# Altium footprint library laihi.PcbLib: 222 footprints (part 7 of 14)
Each footprint in its own frame and in the unit in brackets; x right, y up, seen from the top. Pads: shape width x height; smd on the part's side, far side on the other; paste and mask are expansions set on the pad; w line width, h text height; cw(c..) or ccw(c..) is an arc to the next point about the centre after c.
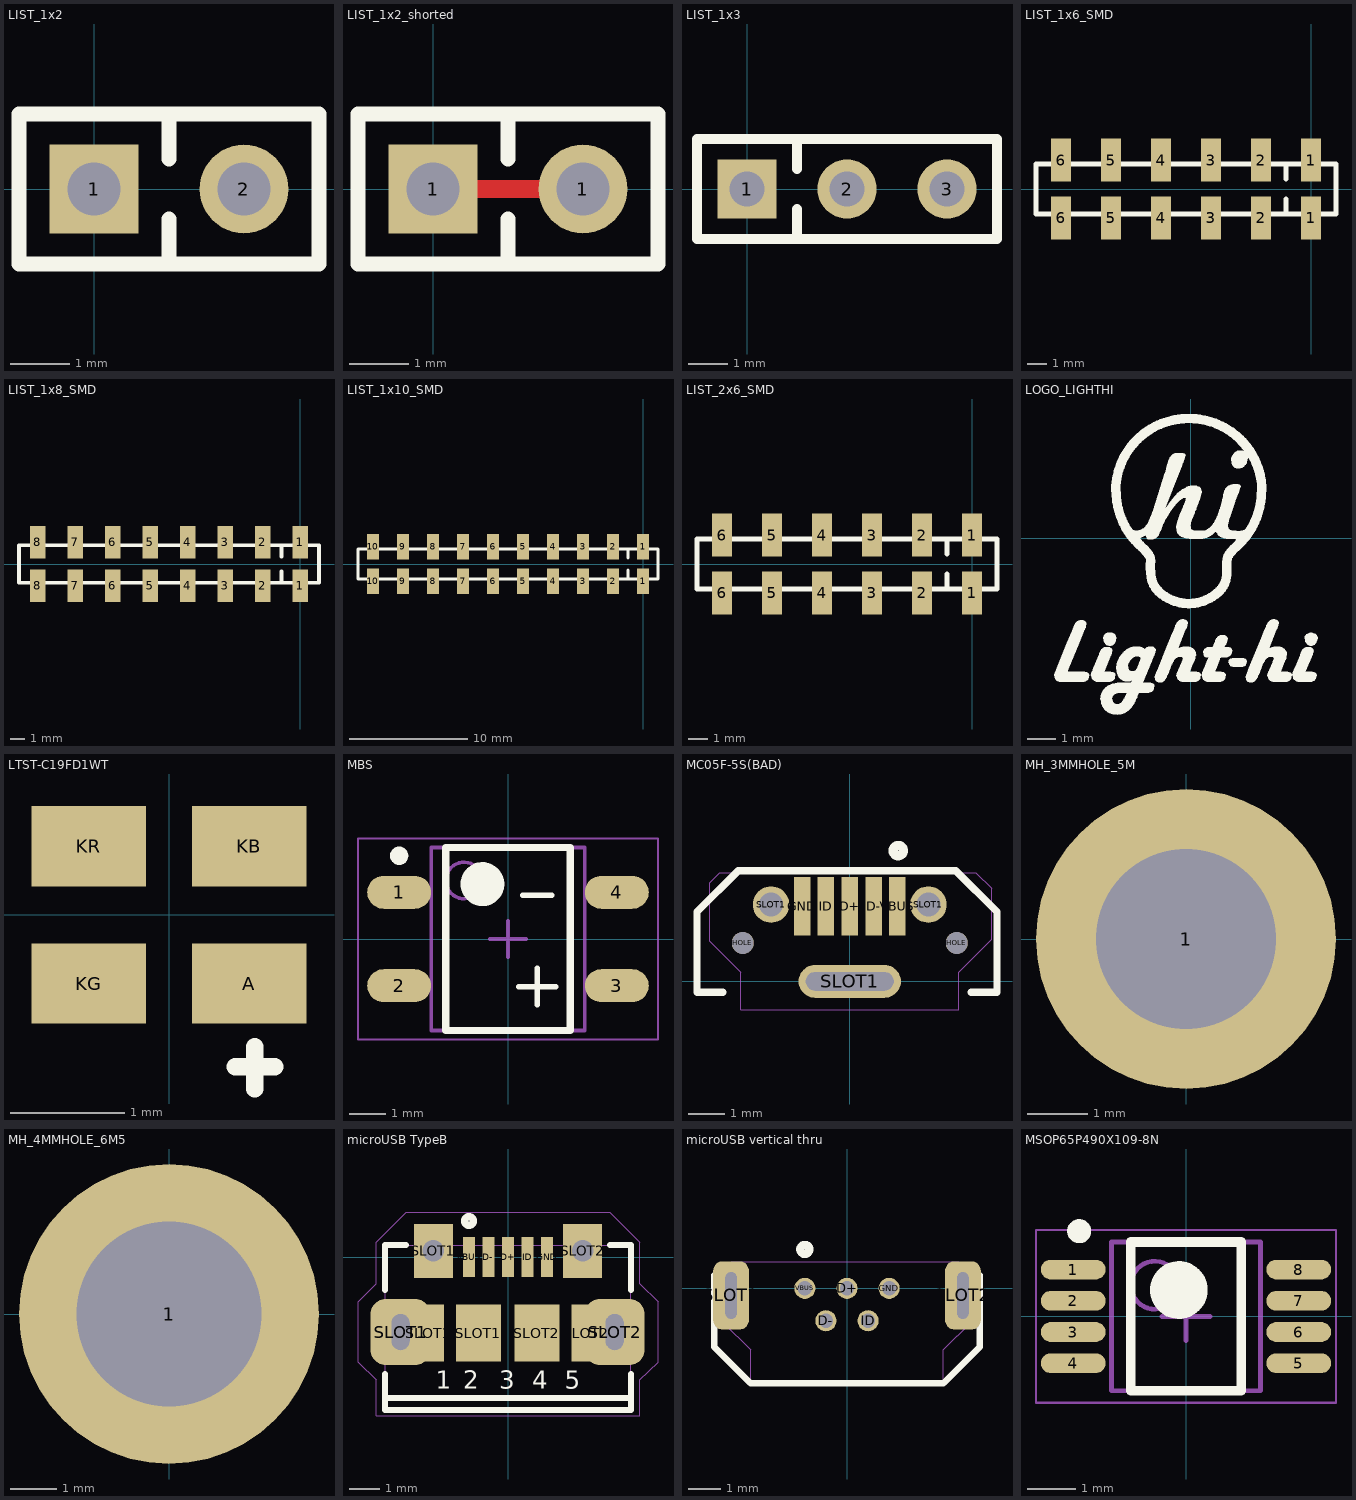
[diagram p6: the footprints below, top view; thin cyan lines are the x and y axes]

## LIST_1x2 [mm]
pads (2):
  rect 1.5x1.5 hole 0.9: 1(0,0)
  round 1.5 hole 0.9: 2(2.54,0)
Top Overlay:
  lines w0.254: 1.27,-1.27 1.27,-0.508 ; 1.27,0.508 1.27,1.27 ; -1.27,-1.27 3.81,-1.27 3.81,1.27 -1.27,1.27 -1.27,-1.27

## LIST_1x2_shorted [mm]
pads (2):
  rect 1.5x1.5 hole 0.9: 1(0,0)
  round 1.5 hole 0.9: 1(2.54,0)
Top Layer:
  lines w0.305: 0,0 2.54,0
Top Overlay:
  lines w0.254: 1.27,-1.27 1.27,-0.508 ; 1.27,0.508 1.27,1.27 ; -1.27,-1.27 -1.27,1.27 3.81,1.27 3.81,-1.27 -1.27,-1.27
Top Solder:
  rectangle: 1,-0.5 1.5,0.5

## LIST_1x3 [mm]
pads (3):
  rect 1.5x1.5 hole 0.9: 1(0,0)
  round 1.5 hole 0.9: 2(2.54,0) 3(5.08,0)
Top Overlay:
  lines w0.254: 1.27,-1.27 1.27,-0.508 ; 1.27,0.508 1.27,1.27 ; -1.27,-1.27 6.35,-1.27 6.35,1.27 -1.27,1.27 -1.27,-1.27
3D body "pin_header_aw140-eg-g03d.stp": height 8.2, standoff -3, extent -1.27,-1.27 6.25,1.23

## LIST_1x6_SMD [mm] "Pin List, 2.54mm, SMD"
height 9.5
pads (12):
  rect 1.02x2.19 smd: 1(0,-1.465) 1(0,1.465) 2(-2.54,-1.465) 2(-2.54,1.465) 3(-5.08,-1.465) 3(-5.08,1.465) 4(-7.62,-1.465) 4(-7.62,1.465) 5(-10.16,-1.465) 5(-10.16,1.465) 6(-12.7,-1.465) 6(-12.7,1.465)
Top Overlay:
  lines w0.254: -1.27,-1.27 -1.27,-0.508 ; -1.27,0.508 -1.27,1.27 ; -13.97,-1.27 1.27,-1.27 1.27,1.27 -13.97,1.27 -13.97,-1.27

## LIST_1x8_SMD [mm] "Pin List, 2.54mm, SMD"
height 9.5
pads (16):
  rect 1.02x2.19 smd: 1(0,-1.465) 1(0,1.465) 2(-2.54,-1.465) 2(-2.54,1.465) 3(-5.08,-1.465) 3(-5.08,1.465) 4(-7.62,-1.465) 4(-7.62,1.465) 5(-10.16,-1.465) 5(-10.16,1.465) 6(-12.7,-1.465) 6(-12.7,1.465) 7(-15.24,-1.465) 7(-15.24,1.465) 8(-17.78,-1.465) 8(-17.78,1.465)
Top Overlay:
  lines w0.254: -1.27,-1.27 -1.27,-0.508 ; -1.27,0.508 -1.27,1.27 ; -19.05,-1.27 1.27,-1.27 1.27,1.27 -19.05,1.27 -19.05,-1.27

## LIST_1x10_SMD [mm] "Pin List, 2.54mm, SMD"
height 9.5
pads (20):
  rect 1.02x2.19 smd: 1(0,-1.465) 1(0,1.465) 2(-2.54,-1.465) 2(-2.54,1.465) 3(-5.08,-1.465) 3(-5.08,1.465) 4(-7.62,-1.465) 4(-7.62,1.465) 5(-10.16,-1.465) 5(-10.16,1.465) 6(-12.7,-1.465) 6(-12.7,1.465) 7(-15.24,-1.465) 7(-15.24,1.465) 8(-17.78,-1.465) 8(-17.78,1.465) 9(-20.32,-1.465) 9(-20.32,1.465) 10(-22.86,-1.465) 10(-22.86,1.465)
Top Overlay:
  lines w0.254: -1.27,-1.27 -1.27,-0.508 ; -1.27,0.508 -1.27,1.27 ; -24.13,-1.27 1.27,-1.27 1.27,1.27 -24.13,1.27 -24.13,-1.27

## LIST_2x6_SMD [mm] "Pin List, 2.54mm, SMD"
height 9.5
pads (12):
  rect 1.02x2.19 smd: 1(0,-1.465) 1(0,1.465) 2(-2.54,-1.465) 2(-2.54,1.465) 3(-5.08,-1.465) 3(-5.08,1.465) 4(-7.62,-1.465) 4(-7.62,1.465) 5(-10.16,-1.465) 5(-10.16,1.465) 6(-12.7,-1.465) 6(-12.7,1.465)
Top Overlay:
  lines w0.254: -1.27,-1.27 -1.27,-0.508 ; -1.27,0.508 -1.27,1.27 ; -13.97,-1.27 -13.97,1.27 1.27,1.27 1.27,-1.27 -13.97,-1.27

## LOGO_LIGHTHI [mm]
Top Overlay:
  drawing of 6386 lines, arcs and shapes, not listed

## LTST-C19FD1WT [mm] "Lite-on tricolor LED"
height 0.55
pads (4):
  rect 1x0.7 smd: A(0.7,-0.6) KB(0.7,0.6) KG(-0.7,-0.6) KR(-0.7,0.6)
Top Overlay:
  lines w0.152: 0.58,-1.325 0.925,-1.325 ; 0.75,-1.52 0.75,-1.15
3D body "User Library-GeyerElectronics_KX6.step": height 0.56, standoff 0, extent -1.25,-1 1.27,1
3D body: height 0.56, standoff 0.15, extent -1.05,-0.8 1.05,0.8

## MBS [mm] "BESOP, 4-Leads, Body 4.75x3.90mm, Pitch 2.55mm, IPC Medium Density"
height 2.7
pads (4):
  oval 1.75x0.9 smd: 1(-2.975,1.275) 2(-2.975,-1.275) 3(2.975,-1.275) 4(2.975,1.275)
Top Overlay:
  circle w0.6: c-0.7,1.5 r0.3
  circle w0.25: c-2.975,2.275 r0.125
  lines w0.15: 0.3,-1.3 1.3,-1.3 ; 0.4,1.2 1.2,1.2 ; 0.8,-1.8 0.8,-0.8
  lines w0.2: -1.7,-2.5 1.7,-2.5 1.7,2.5 -1.7,2.5 -1.7,-2.5
Mechanical 13:
  circle w0.1: c-1.2,1.6 r0.5
  lines w0.1: -2.1,-2.5 2.1,-2.5 2.1,2.5 -2.1,2.5 -2.1,-2.5
Mechanical 15:
  lines w0.05: -4.1,-2.75 4.1,-2.75 4.1,2.75 -4.1,2.75 -4.1,-2.75
  lines w0.1: -0.5,0 0.5,0 ; 0,-0.5 0,0.5
3D body "MBS.step": height 2.7, standoff 0, extent -3.35,-2.5 3.35,2.5

## MC05F-5S(BAD) [mm] "Micro USB 5F B TYPE 180度 SMT 有柱 有卷边"
height 5.75
pads (10):
  rect 0.45x1.6 smd: D+(0,2.05) D-(0.65,2.05) GND(-1.3,2.05) ID(-0.65,2.05) VBUS(1.3,2.05)
  round 0.6 hole 0.6 unplated paste+0: HOLE(-2.925,1.05) HOLE(2.925,1.05)
  round 1 hole 0.65 paste+0: SLOT1(-2.15,2.1) SLOT1(2.15,2.1)
  rrect100% 2.8x0.9 hole 0.5 slot 2.4 at 0 deg: SLOT1(0,0)
Top Overlay:
  circle w0.25: c1.325,3.575 r0.141
  lines w0.2: -3.475,-0.3 -4.175,-0.3 -4.175,1.2 -4.175,1.9 -3.05,3.025 2.9,3.025 4.025,1.9 4.025,1.2 4.025,-0.3 3.325,-0.3
Mechanical 15:
  lines w0.025: 3.825,1.1 2.975,0.25 ; 2.975,0.25 3.875,1.15 3.875,2.55 3.45,2.975 -3.55,2.975 -3.825,2.7 -3.825,1.1 -2.975,0.25 -2.975,-0.525 -2.975,-0.775 2.975,-0.775 2.975,0.25
3D body "1051330011.stp": height 7.43, standoff -2.37, extent -4.067,-1.161 3.958,3.289

## MH_3MMHOLE_5M [mm]
pads (1):
  round 5 hole 3: 1(0,0)
Mechanical 13:
  circle w0.025: c0,0 r1.3
Mechanical 15:
  circle w0.025: c0,0 r1.35

## MH_4MMHOLE_6M5 [mm]
pads (1):
  round 6.5 hole 4: 1(0,0)
Mechanical 13:
  circle w0.025: c0,0 r1.3
Mechanical 15:
  circle w0.025: c0,0 r1.35

## microUSB TypeB [mm] "Micro USB Type-B Bottom-Mount"
height 2.94
pads (13):
  rect 0.4x1.35 smd: D+(0,0) D-(-0.65,0) GND(1.3,0) ID(0.65,0) VBUS(-1.3,0)
  rrect50% 2x2.2 hole 0.6 slot 1.2 at 90 deg: SLOT1(-3.581,-2.5) SLOT2(3.556,-2.5)
  rect 1x1.9 smd: SLOT1(-2.642,-2.54) SLOT2(2.616,-2.54)
  rect 1.3x1.8 hole 0.72: SLOT1(-2.49,0.203) SLOT2(2.49,0.203)
  rect 1.5x1.9 smd: SLOT1(-0.991,-2.54) SLOT2(0.965,-2.54)
Top Overlay:
  circle w0.25: c-1.3,1.2 r0.141
  lines w0.2: -4.1,-4.7 4,-4.7 ; -4.1,-3.9 -4.1,-5.1 4.1,-5.1 4.1,-3.9 ; -4.1,-1.1 -4.1,0.4 -3.4,0.4 ; 3.4,0.4 4.1,0.4 4.1,-1.1
  text "4" at 0.8,-4.4 h0.6
  text "3" at -0.3,-4.4 h0.6
  text "2" at -1.5,-4.4 h0.6
  text "5" at 1.9,-4.4 h0.6
  text "1" at -2.4,-4.4 h0.6
Mechanical 13:
  lines w0.025: -4.1,-4.7 4.1,-4.7 ; -4.1,-5.1 4.1,-5.1 4.1,0.4 -4.1,0.4 -4.1,-5.1
Mechanical 15:
  lines w0.025: -5,-3.5 -4.4,-4.1 -4.4,-5.3 4.4,-5.3 4.4,-4.1 5,-3.5 5,-1.5 4.4,-0.9 4.4,0.5 3.4,1.5 -3.4,1.5 -4.4,0.5 -4.4,-0.9 -5,-1.5 -5,-3.5
3D body "USB-uB_Bottom_Mount_RA_Molex_1050170001.stp": height 2.68, standoff -0.63, extent -4.111,-5.074 4.089,0.356

## microUSB vertical thru [mm] "Micro USB Type-B thru vertical"
height 5.61
pads (7):
  round 0.65 hole 0.44: D+(0,0) D-(-0.65,-1) GND(1.3,0) ID(0.65,-1) VBUS(-1.3,0)
  rrect50% 1.1x2.1 hole 0.35 slot 1.44 at 90 deg: SLOT1(-3.575,-0.22) SLOT2(3.575,-0.22)
Top Overlay:
  circle w0.25: c-1.3,1.2 r0.141
  lines w0.2: -3.4,0.4 -4.1,0.4 -4.1,-1.1 -4.1,-1.8 -2.975,-2.925 2.975,-2.925 4.1,-1.8 4.1,-1.1 4.1,0.4 3.4,0.4
Mechanical 15:
  lines w0.025: 3.825,-1.05 2.975,-1.9 ; 2.975,-1.9 2.975,-2.925 -2.975,-2.925 -2.975,-2.675 -2.975,-1.9 -3.825,-1.05 -3.825,0.55 -3.55,0.825 3.45,0.825 3.875,0.4 3.875,-1 2.975,-1.9

## MSOP65P490X109-8N [mm] "MSOP, 8-Leads, Body 3.00x3.00mm, Pitch 0.65mm, IPC Medium Density"
height 1.09
pads (8):
  oval 1.35x0.41 smd mask+0.075: 1(-2.35,0.975) 2(-2.35,0.325) 3(-2.35,-0.325) 4(-2.35,-0.975) 5(2.35,-0.975) 6(2.35,-0.325) 7(2.35,0.325) 8(2.35,0.975)
Top Overlay:
  circle w0.6: c-0.15,0.55 r0.3
  circle w0.25: c-2.225,1.775 r0.125
  lines w0.2: -1.15,-1.55 1.15,-1.55 1.15,1.55 -1.15,1.55 -1.15,-1.55
Mechanical 13:
  circle w0.1: c-0.65,0.65 r0.5
  lines w0.1: -1.55,-1.55 1.55,-1.55 1.55,1.55 -1.55,1.55 -1.55,-1.55
Mechanical 15:
  lines w0.05: -3.125,-1.8 3.125,-1.8 3.125,1.8 -3.125,1.8 -3.125,-1.8
  lines w0.1: -0.5,0 0.5,0 ; 0,-0.5 0,0.5
3D body "MSOP65P490X109-8N.step": height 1.09, standoff 0, extent -2.45,-1.55 2.45,1.55